# Altium footprint library 其他.PcbLib: 13 footprints
Each footprint in its own frame and in the unit in brackets; x right, y up, seen from the top. Pads: shape width x height; smd on the part's side, far side on the other; paste and mask are expansions set on the pad; w line width, h text height; cw(c..) or ccw(c..) is an arc to the next point about the centre after c.
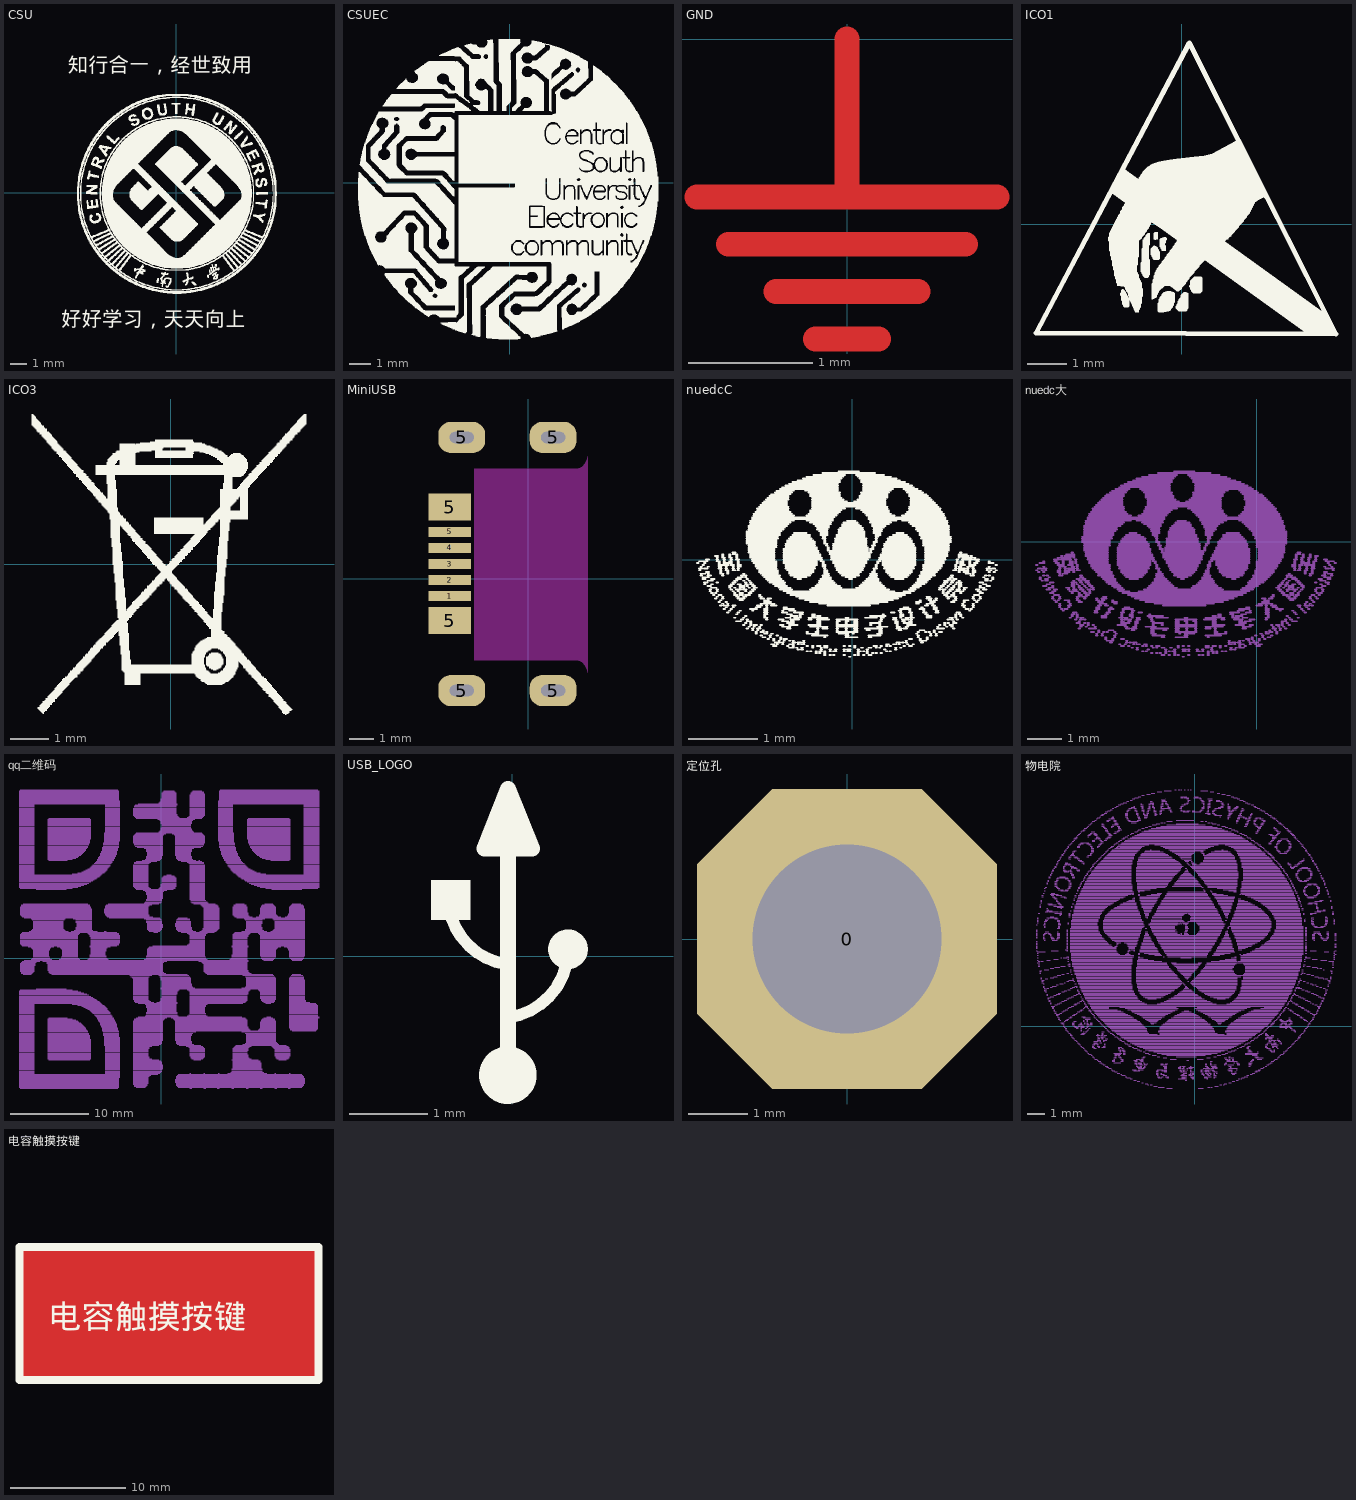
[diagram p0: the footprints below, top view; thin cyan lines are the x and y axes]

## CSU [mil]
Top Overlay:
  drawing of 5268 lines, arcs and shapes, not listed
  text "好好学习，天天向上" at -270,-325 h60
  text "知行合一，经世致用" at -255,270 h60

## CSUEC [mil]
Top Overlay:
  drawing of 5353 lines, arcs and shapes, not listed

## GND [mil]
Top Layer:
  lines w7.87: -47.5,-50 47.5,-50 ; -37.5,-65 37.5,-65 ; -22.5,-80 22.5,-80 ; -10,-95 10,-95 ; 0,-50 0,0

## ICO1 [mil]
Top Overlay:
  drawing of 14 lines, arcs and shapes, not listed

## ICO3 [mil]
Top Overlay:
  drawing of 1020 lines, arcs and shapes, not listed

## MiniUSB [mm] "沉板式"
pads (11):
  rect 1.72x0.4 smd: 1(-3.175,-0.71) 2(-3.175,-0.06) 3(-3.175,0.59) 4(-3.175,1.24) 5(-3.175,1.89)
  rect 1.72x1.1 smd: 5(-3.175,-1.702) 5(-3.175,2.896)
  rrect80% 1.9x1.27 hole 0.457 slot 0.98 at 0 deg: 5(-2.684,-4.535) 5(-2.684,5.715) 5(1.016,-4.535) 5(1.016,5.715)
Keep-Out Layer:
  board cut-out: -2.187,-3.302 1.905,-3.302 2.004,-3.312 2.187,-3.388 2.327,-3.528 2.403,-3.711 2.413,-3.81 2.413,4.953 2.403,4.854 2.327,4.671 2.187,4.531 2.004,4.455 1.905,4.445 -2.187,4.445

## nuedcС [mil]
Top Overlay:
  drawing of 923 lines, arcs and shapes, not listed

## nuedc大 [mil]
Bottom Overlay:
  drawing of 923 lines, arcs and shapes, not listed

## qq二维码 [mil]
Top Solder:
  drawing of 1614 lines, arcs and shapes, not listed

## USB_LOGO [mil]
height 400
Top Overlay:
  circle w15: c-2.1,-59.78 r7
  circle w10: c28.18,3.56 r5
  rectangle: -40.9,18.22 -20.82,38.3
  lines w6: -30.67,19.85 ccw(c2.67,30.48) -2.02,-4.19 ; -2.02,-30.85 ccw(c-6.72,3.82) 28.21,1.79
  lines w8: -2.02,-54.47 -2.02,84.22 ; -2.02,54.14 -2.02,84.22 ; -2.02,84.22 -13.82,54.22 10.18,54.22 -2.02,84.22
  lines w15: -2.02,58.22 -2.02,62.22

## 定位孔 [mm]
pads (1):
  oct 5.08x5.08 hole 3.2: 0(0,0)

## 物电院 [mil]
Bottom Overlay:
  drawing of 2736 lines, arcs and shapes, not listed

## 电容触摸按键 [mil]
Top Layer:
  region: 2132.72,-1480.31 2132.72,-1007.87 1109.09,-1007.87 1109.09,-1480.31
Top Overlay:
  lines w27.56: 1110,-1470 1110,-1015 2130,-1015 2130,-1470 1110,-1470
  text "电容触摸按键" at 1210,-1320 h141.73